# Altium footprint library myintlib.PcbLib: 39 footprints (part 3 of 3)
Each footprint in its own frame and in the unit in brackets; x right, y up, seen from the top. Pads: shape width x height; smd on the part's side, far side on the other; paste and mask are expansions set on the pad; w line width, h text height; cw(c..) or ccw(c..) is an arc to the next point about the centre after c.
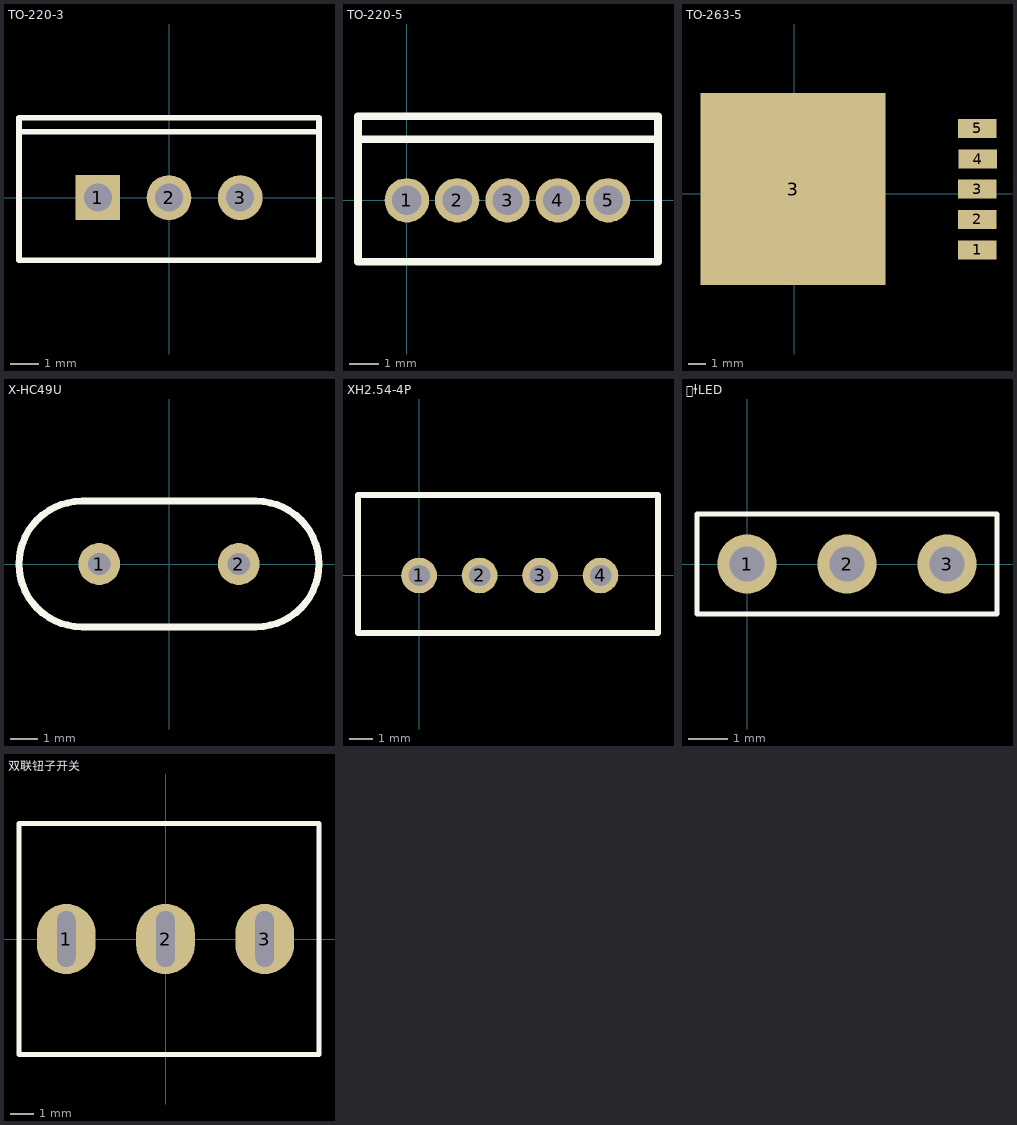
[diagram p2: the footprints below, top view; thin cyan lines are the x and y axes]

## TO-220-3 [mm]
pads (3):
  rect 1.6x1.6 hole 1: 1(-2.54,0)
  round 1.6 hole 1: 2(0,0) 3(2.54,0)
Top Overlay:
  lines w0.2: -5.35,2.35 5.35,2.35 ; -5.35,-2.235 -5.35,2.85 5.35,2.85 5.35,-2.235 -5.35,-2.235
3D body: height 21.1, standoff -8.73, extent -7.225,-1.829 7.175,9.093

## TO-220-5 [mm]
pads (5):
  round 1.5 hole 1: 1(0,0) 2(1.7,0) 3(3.4,0) 4(5.1,0) 5(6.8,0)
Top Overlay:
  lines w0.254: -1.651,2.057 8.458,2.057 ; -1.651,-2.083 8.484,-2.083 8.484,2.845 -1.651,2.845 -1.651,-2.083
3D body: height 21.19, standoff -8.09, extent -3.8,-2.108 10.6,9.308

## TO-263-5 [mm]
pads (6):
  rect 2.16x1.07 smd: 1(10.287,-3.175) 2(10.287,-1.448) 3(10.287,0.254) 4(10.312,1.93) 5(10.287,3.658)
  rect 10.41x10.8 smd: 3(-0.076,0.254)
3D body: height 4.83, standoff 0.03, extent -4.863,-4.775 10.807,5.225

## X-HC49U [mil] "直插无源晶振"
pads (2):
  round 60 hole 32: 1(-100,0) 2(100,0)
Top Overlay:
  lines w10: -125,-90 cw(c-125,0) -125,90 125,90 cw(c125,0) 125,-90 -125,-90
3D body: height 86.61, standoff -118.11, extent -185.75,-88.92 193.75,91

## XH2.54-4P [mm] "SWD下载口"
pads (4):
  round 1.5 hole 0.9: 1(0,0) 2(2.54,0) 3(5.08,0) 4(7.62,0)
Top Overlay:
  lines w0.254: -2.565,-2.413 -2.565,3.378 10.033,3.378 10.033,-2.413 -2.565,-2.413
3D body: height 7, standoff -3.4, extent -2.566,-2.422 10.034,3.378

## ˫ɫLED [mm] "共阳"
pads (3):
  round 1.5 hole 0.9: 1(0,0) 2(2.54,0) 3(5.08,0)
Top Overlay:
  lines w0.127: -1.27,-1.27 -1.27,1.27 6.35,1.27 6.35,-1.27 -1.27,-1.27
3D body: height 12.08, standoff -3.92, extent -0.427,-2.879 5.507,2.921

## 双联钮子开关 [mm]
pads (3):
  oval 2.54x3.04 hole 0.8 slot 2.42 at 90 deg: 1(-4.3,0) 2(0,0) 3(4.3,0)
Top Overlay:
  lines w0.2: -6.35,-5.004 6.652,-5.004 6.652,5.004 -6.35,5.004 -6.35,-5.004
3D body: height 26.57, standoff -3.43, extent -6.348,-4.996 6.652,5.004